# Altium footprint library MainFPs.PcbLib: 215 footprints (part 6 of 14)
Each footprint in its own frame and in the unit in brackets; x right, y up, seen from the top. Pads: shape width x height; smd on the part's side, far side on the other; paste and mask are expansions set on the pad; w line width, h text height; cw(c..) or ccw(c..) is an arc to the next point about the centre after c.
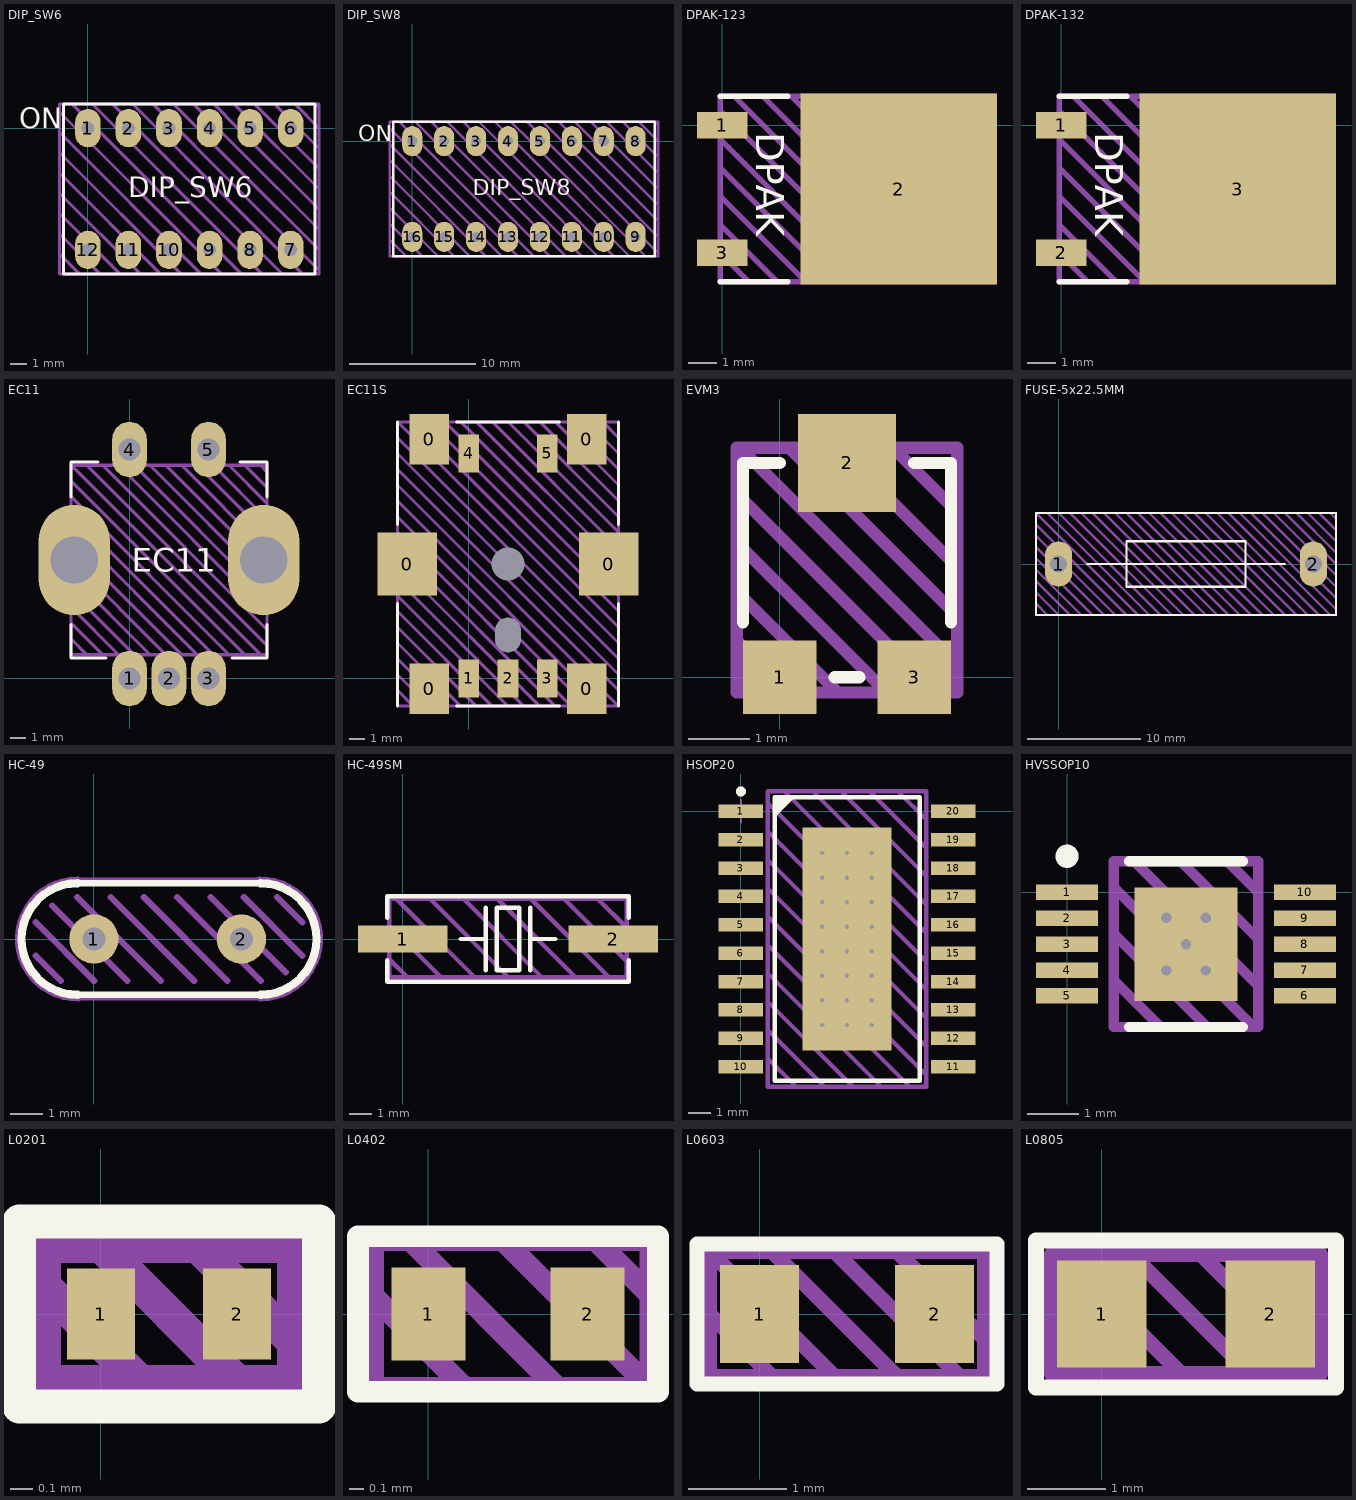
[diagram p5: the footprints below, top view; thin cyan lines are the x and y axes]

## DIP_SW6 [mm]
pads (12):
  oval 1.6x2.4 hole 0.8: 1(0,0) 2(2.54,0) 3(5.08,0) 4(7.62,0) 5(10.16,0) 6(12.7,0) 7(12.7,-7.62) 8(10.16,-7.62) 9(7.62,-7.62) 10(5.08,-7.62) 11(2.54,-7.62) 12(0,-7.62)
Top Overlay:
  lines w0.2: -1.524,-9.144 14.224,-9.144 14.224,1.524 -1.524,1.524 -1.524,-9.144
  text "ON" at -4.318,0 h1.27
  text "DIP_SW6" at 2.54,-4.318 h1.27
Top Draw:
  lines w0.2: -1.778,-7.874 -0.508,-9.144 ; -1.778,-6.604 0.762,-9.144 ; -1.778,-5.334 2.032,-9.144 ; -1.778,-4.064 3.302,-9.144 ; -1.778,-2.794 4.572,-9.144 ; -1.778,-1.524 5.842,-9.144 ; -1.778,-0.254 7.112,-9.144 ; -1.778,1.016 8.382,-9.144 ; -1.016,1.524 9.398,-8.89 9.652,-9.144 ; 0.254,1.524 9.398,-7.62 10.922,-9.144 ; 1.524,1.524 9.398,-6.35 12.192,-9.144 ; 2.794,1.524 9.398,-5.08 13.462,-9.144 ; 4.064,1.524 9.398,-3.81 14.478,-8.89 14.478,-9.144 ; 5.334,1.524 9.398,-2.54 14.478,-7.62 ; 6.604,1.524 9.398,-1.27 14.478,-6.35 ; 7.874,1.524 9.398,0 14.478,-5.08 ; 9.144,1.524 9.398,1.27 14.478,-3.81 ; 10.414,1.524 14.478,-2.54 ; 11.684,1.524 14.478,-1.27 ; 12.954,1.524 14.478,0 ; 14.224,1.524 14.478,1.27 ; 10.922,-9.144 10.922,-9.144 ; 14.478,-9.144 -1.778,-9.144 -1.778,1.524 14.478,1.524 14.478,-9.144
Top Info:
  text "'.Comment'" at 1.039,-11.016 h1.25
3D body: height 0.25, standoff -1.78, extent 12.446,-7.747 12.954,-7.493
3D body: height 0.25, standoff -1.78, extent 12.446,-0.127 12.954,0.127
3D body: height 0.25, standoff -1.78, extent 9.906,-0.127 10.414,0.127
3D body: height 0.25, standoff -1.78, extent 9.906,-7.747 10.414,-7.493
3D body: height 6.86, standoff 6.32, extent 10.922,-5.588 11.938,-2.032
3D body: height 6.86, standoff 6.32, extent 13.462,-5.588 14.478,-2.032
3D body: height 6.43, standoff 6.32, extent 9.398,-5.588 10.922,-2.032
3D body: height 7.62, standoff 6.32, extent 9.398,-3.302 10.922,-2.032
3D body: height 6.43, standoff 6.32, extent 11.938,-5.588 13.462,-2.032
3D body: height 7.62, standoff 6.32, extent 11.938,-3.302 13.462,-2.032
3D body: height 7.62, standoff 6.32, extent 6.858,-3.302 8.382,-2.032
3D body: height 6.43, standoff 6.32, extent 6.858,-5.588 8.382,-2.032
3D body: height 7.62, standoff 6.32, extent 4.318,-3.302 5.842,-2.032
3D body: height 6.43, standoff 6.32, extent 4.318,-5.588 5.842,-2.032
3D body: height 7.62, standoff 6.32, extent 1.778,-3.302 3.302,-2.032
3D body: height 6.43, standoff 6.32, extent 1.778,-5.588 3.302,-2.032
3D body: height 6.43, standoff 6.32, extent -0.762,-5.588 0.762,-2.032
3D body: height 6.86, standoff 6.32, extent 8.382,-5.588 9.398,-2.032
3D body: height 6.86, standoff 6.32, extent 5.842,-5.588 6.858,-2.032
3D body: height 6.86, standoff 6.32, extent 3.302,-5.588 4.318,-2.032
3D body: height 6.86, standoff 0.25, extent -1.778,-9.144 14.478,-5.588
3D body: height 6.86, standoff 0.25, extent -1.778,-2.032 14.478,1.524
3D body: height 6.35, standoff 0, extent -1.778,-9.144 14.478,1.524
3D body: height 0.25, standoff -1.78, extent -0.254,-7.747 0.254,-7.493
3D body: height 0.25, standoff -1.78, extent 2.286,-7.747 2.794,-7.493
3D body: height 0.25, standoff -1.78, extent 4.826,-7.747 5.334,-7.493
3D body: height 0.25, standoff -1.78, extent -0.254,-0.127 0.254,0.127
3D body: height 0.25, standoff -1.78, extent 2.286,-0.127 2.794,0.127
3D body: height 0.25, standoff -1.78, extent 4.826,-0.127 5.334,0.127
3D body: height 0.25, standoff -1.78, extent 7.366,-0.127 7.874,0.127
3D body: height 0.25, standoff -1.78, extent 7.366,-7.747 7.874,-7.493
3D body: height 6.86, standoff 6.32, extent -1.524,-5.588 -0.762,-2.032
3D body: height 6.86, standoff 6.32, extent 0.762,-5.588 1.778,-2.032
3D body: height 7.62, standoff 6.32, extent -0.762,-3.302 0.762,-2.032

## DIP_SW8 [mm]
pads (16):
  oval 1.6x2.4 hole 0.8: 1(0,0) 2(2.54,0) 3(5.08,0) 4(7.62,0) 5(10.16,0) 6(12.7,0) 7(15.24,0) 8(17.78,0) 9(17.78,-7.62) 10(15.24,-7.62) 11(12.7,-7.62) 12(10.16,-7.62) 13(7.62,-7.62) 14(5.08,-7.62) 15(2.54,-7.62) 16(0,-7.62)
Top Overlay:
  lines w0.2: -1.524,-9.144 -1.524,1.524 19.304,1.524 19.304,-1.143 19.304,-6.477 19.304,-9.144 -1.524,-9.144
  text "ON" at -4.318,0 h1.27
  text "DIP_SW8" at 4.826,-4.318 h1.27
Top Draw:
  lines w0.2: -1.778,-7.874 -0.508,-9.144 ; -1.778,-6.604 0.762,-9.144 ; -1.778,-5.334 2.032,-9.144 ; -1.778,-4.064 3.302,-9.144 ; -1.778,-2.794 4.572,-9.144 ; -1.778,-1.524 5.842,-9.144 ; -1.778,-0.254 7.112,-9.144 ; -1.778,1.016 8.382,-9.144 ; -1.016,1.524 9.398,-8.89 9.652,-9.144 ; 0.254,1.524 9.398,-7.62 10.922,-9.144 ; 1.524,1.524 9.398,-6.35 12.192,-9.144 ; 2.794,1.524 9.398,-5.08 13.462,-9.144 ; 4.064,1.524 9.398,-3.81 14.605,-9.017 ; 5.334,1.524 9.398,-2.54 16.002,-9.144 ; 6.604,1.524 9.398,-1.27 17.272,-9.144 17.78,-9.144 ; 7.874,1.524 9.398,0 18.542,-9.144 ; 9.144,1.524 9.398,1.27 19.558,-8.89 ; 10.414,1.524 19.558,-7.62 ; 11.684,1.524 19.558,-6.35 ; 12.954,1.524 19.558,-5.08 ; 14.224,1.524 19.558,-3.81 19.558,-9.144 14.478,-9.144 -1.778,-9.144 -1.778,1.524 19.558,1.524 19.558,-4.064 ; 15.494,1.524 19.558,-2.54 ; 16.764,1.524 19.558,-1.27 ; 18.034,1.524 19.558,0 ; 19.304,1.524 19.558,1.27 ; 10.922,-9.144 10.922,-9.144
Top Info:
  text "'.Comment'" at 3.579,-11.016 h1.25
3D body: height 6.86, standoff 6.32, extent 18.542,-5.588 19.558,-2.032
3D body: height 6.86, standoff 6.32, extent 16.002,-5.588 17.018,-2.032
3D body: height 6.43, standoff 6.32, extent 17.018,-5.588 18.542,-2.032
3D body: height 7.62, standoff 6.32, extent 17.018,-3.302 18.542,-2.032
3D body: height 6.43, standoff 6.32, extent 14.478,-5.588 16.002,-2.032
3D body: height 7.62, standoff 6.32, extent 14.478,-3.302 16.002,-2.032
3D body: height 7.62, standoff 6.32, extent -0.762,-3.302 0.762,-2.032
3D body: height 6.86, standoff 6.32, extent 0.762,-5.588 1.778,-2.032
3D body: height 6.86, standoff 6.32, extent -1.524,-5.588 -0.762,-2.032
3D body: height 0.25, standoff -1.78, extent 7.366,-7.747 7.874,-7.493
3D body: height 0.25, standoff -1.78, extent 7.366,-0.127 7.874,0.127
3D body: height 0.25, standoff -1.78, extent 4.826,-0.127 5.334,0.127
3D body: height 0.25, standoff -1.78, extent 2.286,-0.127 2.794,0.127
3D body: height 0.25, standoff -1.78, extent -0.254,-0.127 0.254,0.127
3D body: height 0.25, standoff -1.78, extent 4.826,-7.747 5.334,-7.493
3D body: height 0.25, standoff -1.78, extent 2.286,-7.747 2.794,-7.493
3D body: height 0.25, standoff -1.78, extent -0.254,-7.747 0.254,-7.493
3D body: height 6.35, standoff 0, extent -1.778,-9.144 19.558,1.524
3D body: height 6.86, standoff 0.25, extent -1.778,-2.032 19.558,1.524
3D body: height 6.86, standoff 0.25, extent -1.778,-9.144 19.558,-5.588
3D body: height 6.86, standoff 6.32, extent 3.302,-5.588 4.318,-2.032
3D body: height 6.86, standoff 6.32, extent 5.842,-5.588 6.858,-2.032
3D body: height 6.86, standoff 6.32, extent 8.382,-5.588 9.398,-2.032
3D body: height 6.43, standoff 6.32, extent -0.762,-5.588 0.762,-2.032
3D body: height 6.43, standoff 6.32, extent 1.778,-5.588 3.302,-2.032
3D body: height 7.62, standoff 6.32, extent 1.778,-3.302 3.302,-2.032
3D body: height 6.43, standoff 6.32, extent 4.318,-5.588 5.842,-2.032
3D body: height 7.62, standoff 6.32, extent 4.318,-3.302 5.842,-2.032
3D body: height 6.43, standoff 6.32, extent 6.858,-5.588 8.382,-2.032
3D body: height 7.62, standoff 6.32, extent 6.858,-3.302 8.382,-2.032
3D body: height 7.62, standoff 6.32, extent 11.938,-3.302 13.462,-2.032
3D body: height 6.43, standoff 6.32, extent 11.938,-5.588 13.462,-2.032
3D body: height 7.62, standoff 6.32, extent 9.398,-3.302 10.922,-2.032
3D body: height 6.43, standoff 6.32, extent 9.398,-5.588 10.922,-2.032
3D body: height 6.86, standoff 6.32, extent 13.462,-5.588 14.478,-2.032
3D body: height 6.86, standoff 6.32, extent 10.922,-5.588 11.938,-2.032
3D body: height 0.25, standoff -1.78, extent 9.906,-7.747 10.414,-7.493
3D body: height 0.25, standoff -1.78, extent 9.906,-0.127 10.414,0.127
3D body: height 0.25, standoff -1.78, extent 12.446,-0.127 12.954,0.127
3D body: height 0.25, standoff -1.78, extent 12.446,-7.747 12.954,-7.493
3D body: height 0.25, standoff -1.78, extent 14.986,-0.127 15.494,0.127
3D body: height 0.25, standoff -1.78, extent 17.526,-0.127 18.034,0.127
3D body: height 0.25, standoff -1.78, extent 17.526,-7.747 18.034,-7.493
3D body: height 0.25, standoff -1.78, extent 14.986,-7.747 15.494,-7.493

## DPAK-123 [mm] "TO-252"
pads (3):
  rect 1.8x0.95 smd: 1(0,0) 3(0,-4.56)
  rect 7x6.8 smd: 2(6.3,-2.28)
Top Overlay:
  lines w0.2: -0.073,-5.582 2.34,-5.582 ; -0.073,1.022 2.34,1.022
  text "DPAK" at 1.205,-0.253 h1
Top Draw:
  lines w0.2: -0.073,-4.566 0.943,-5.582 ; -0.073,-3.55 1.959,-5.582 ; -0.073,-2.534 2.975,-5.582 ; -0.073,-1.518 3.991,-5.582 ; -0.073,-0.502 5.007,-5.582 ; -0.073,0.514 6.023,-5.582 ; 0.435,1.022 7.039,-5.582 ; 1.451,1.022 8.055,-5.582 ; 2.467,1.022 9.071,-5.582 ; 3.483,1.022 9.706,-5.201 ; 4.499,1.022 9.706,-4.185 ; 5.515,1.022 9.706,-3.169 ; 6.531,1.022 9.706,-2.153 ; 7.547,1.022 9.706,-1.137 ; 8.563,1.022 9.706,-0.121 ; -0.073,-5.582 -0.073,1.022 9.706,1.022 9.706,-5.582 -0.073,-5.582
Top Info:
  text "'.Comment'" at 0.304,-7.254 h1
3D body "DPAK228P975X230-3N.step": height 2.3, standoff 0, extent -0.2,-5.53 9.55,0.97

## DPAK-132 [mm] "TO-252"
pads (3):
  rect 1.8x0.95 smd: 1(0,0) 2(0,-4.56)
  rect 7x6.8 smd: 3(6.3,-2.28)
Top Overlay:
  lines w0.2: -0.073,-5.582 2.34,-5.582 ; -0.073,1.022 2.34,1.022
  text "DPAK" at 1.205,-0.253 h1
Top Draw:
  lines w0.2: -0.073,-4.566 0.943,-5.582 ; -0.073,-3.55 1.959,-5.582 ; -0.073,-2.534 2.975,-5.582 ; -0.073,-1.518 3.991,-5.582 ; -0.073,-0.502 5.007,-5.582 ; -0.073,0.514 6.023,-5.582 ; 0.435,1.022 7.039,-5.582 ; 1.451,1.022 8.055,-5.582 ; 2.467,1.022 9.071,-5.582 ; 3.483,1.022 9.706,-5.201 ; 4.499,1.022 9.706,-4.185 ; 5.515,1.022 9.706,-3.169 ; 6.531,1.022 9.706,-2.153 ; 7.547,1.022 9.706,-1.137 ; 8.563,1.022 9.706,-0.121 ; -0.073,-5.582 -0.073,1.022 9.706,1.022 9.706,-5.582 -0.073,-5.582
Top Info:
  text "'.Comment'" at 0.304,-7.254 h1
3D body "DPAK228P975X230-3N.step": height 2.3, standoff 0, extent -0.2,-5.53 9.55,0.97

## EC11 [mm]
pads (7):
  oval 2.2x3.5 hole 1.4: 1(0,0) 2(2.5,0) 3(5,0) 4(0,14.5) 5(5,14.5)
  oval 4.5x7 hole 3: ""(-3.5,7.5) ""(8.5,7.5)
Top Overlay:
  lines w0.2: -3.7,3.4 -3.7,1.3 -1.5,1.3 ; -3.7,11.5 -3.7,13.7 -2,13.7 ; 6.5,1.3 8.7,1.3 8.7,3.4 ; 7,13.7 8.7,13.7 8.7,11.5
  text "EC11" at 0.126,6.75 h1.5
Top Draw:
  lines w0.2: -3.7,2.5 -2.7,1.5 ; -3.7,3.5 -1.7,1.5 ; -3.7,4.5 -0.7,1.5 ; -3.7,5.5 0.3,1.5 ; -3.7,6.5 1.3,1.5 ; -3.7,7.5 2.3,1.5 ; -3.7,8.5 3.3,1.5 ; -3.7,9.5 4.3,1.5 ; -3.7,10.5 5.3,1.5 ; -3.7,11.5 6.3,1.5 ; -3.7,12.5 7.3,1.5 ; -2.7,13.5 8.7,2.1 ; -1.7,13.5 8.7,3.1 ; -0.7,13.5 8.7,4.1 ; 0.3,13.5 8.7,5.1 ; 1.3,13.5 8.7,6.1 ; 2.3,13.5 8.7,7.1 ; 3.3,13.5 8.7,8.1 ; 4.3,13.5 8.7,9.1 ; 5.3,13.5 8.7,10.1 ; 6.3,13.5 8.7,11.1 ; 7.3,13.5 8.7,12.1 ; 8.3,1.5 -3.7,13.5 ; 8.3,13.5 8.7,13.1 ; -3.7,13.5 8.7,13.5 8.7,1.5 -3.7,1.5 -3.7,13.5
Top Info:
  text "'.Comment'" at -3.873,-3.975 h1.5
3D body "EC11-THT-15K-thread-green.step": height 19.5, standoff -3.5, extent -3.7,-0.2 8.7,14.7

## EC11S [mm]
pads (13):
  rect 3.75x4 smd: 0(-3.875,7.25) 0(8.875,7.25)
  rect 2.5x3.2 smd: 0(-2.5,-0.65) 0(-2.5,15.15) 0(7.5,-0.65) 0(7.5,15.15)
  rect 1.3x2.4 smd: 1(0,0) 2(2.5,0) 3(5,0) 4(0,14.25) 5(5,14.25)
  round 0 hole 1.6 slot 2.2 at 90 deg: ""(2.5,2.75)
  round 0 hole 2.1: ""(2.5,7.25)
Top Overlay:
  lines w0.2: -4.5,-1.75 -4.5,4.75 ; -4.5,9.75 -4.5,16.25 ; -0.75,-1.75 5.75,-1.75 ; -0.75,16.25 5.75,16.25 ; 9.5,-1.75 9.5,4.75 ; 9.5,9.75 9.5,16.25
Top Draw:
  lines w0.2: -4.5,-0.75 -3.5,-1.75 ; -4.5,0.25 -2.5,-1.75 ; -4.5,1.25 -1.5,-1.75 ; -4.5,2.25 -0.5,-1.75 ; -4.5,3.25 0.5,-1.75 ; -4.5,4.25 1.5,-1.75 ; -4.5,5.25 2.5,-1.75 ; -4.5,6.25 3.5,-1.75 ; -4.5,7.25 4.5,-1.75 ; -4.5,8.25 5.5,-1.75 ; -4.5,9.25 6.5,-1.75 ; -4.5,10.25 7.5,-1.75 ; -4.5,11.25 8.5,-1.75 ; -4.5,12.25 9.5,-1.75 ; -4.5,13.25 9.5,-0.75 ; -4.5,14.25 9.5,0.25 ; -4.5,15.25 9.5,1.25 ; -3.5,16.25 9.5,3.25 ; -2.5,16.25 9.5,4.25 ; -1.5,16.25 9.5,5.25 ; -0.5,16.25 9.5,6.25 ; 0.5,16.25 9.5,7.25 ; 1.5,16.25 9.5,8.25 ; 2.5,16.25 9.5,9.25 ; 3.5,16.25 9.5,10.25 ; 4.5,16.25 9.5,11.25 ; 5.5,16.25 9.5,12.25 ; 6.5,16.25 9.5,13.25 ; 7.5,16.25 9.5,14.25 ; 8.5,16.25 9.5,15.25 ; 9.5,2.25 -4.5,16.25 ; -4.5,16.25 -4.5,-1.75 9.5,-1.75 ; -4.5,16.25 9.5,16.25 9.5,-1.75
Top Info:
  text "'.Comment'" at -3.873,-4.425 h1.5
3D body "PEC11S-929K-S0015.step": height 14, standoff -1.2, extent -4.36,-1.68 9.36,16.18

## EVM3 [mm]
pads (3):
  rect 1.2x1.2 smd: 1(0,0) 3(2.2,0)
  rect 1.6x1.6 smd: 2(1.1,3.5)
Top Overlay:
  lines w0.2: -0.6,0.9 -0.6,3.5 0,3.5 ; 0.9,0 1.3,0 ; 2.2,3.5 2.8,3.5 2.8,0.9
Top Draw:
  lines w0.2: -0.7,0.6 0.125,-0.225 ; -0.7,1.4 0.95,-0.25 1.3,-0.25 ; -0.7,2.2 1.75,-0.25 2,-0.25 ; -0.7,3 2.55,-0.25 ; -0.6,3.7 2.9,0.2 ; 0.2,3.7 2.9,1 2.9,0.2 ; 1,3.7 2.9,1.8 2.9,1.2 ; 1.9,3.7 2.9,2.7 2.9,2.1 ; 2.9,-0.25 -0.7,-0.25 -0.7,3.75 2.9,3.75 2.9,-0.25 ; 2.9,-0.25 2.9,0.2
Top Info:
  text "'.Comment'" at -0.981,-1.435 h0.5

## FUSE-5x22.5MM [mm]
pads (2):
  oval 2.4x4 hole 1.5: 1(0,0) 2(22.5,0)
Top Overlay:
  lines w0.2: 2.5,0 20,0 ; -2,-4.5 -2,4.5 24.5,4.5 24.5,-4.5 -2,-4.5 ; 6,-2 16.5,-2 16.5,2 6,2 6,-2
Top Draw:
  lines w0.2: -2,-3.5 -1,-4.5 ; -2,-2.5 0,-4.5 ; -2,-1.5 1,-4.5 ; -2,-0.5 2,-4.5 ; -2,0.5 3,-4.5 ; -2,1.5 4,-4.5 ; -2,2.5 5,-4.5 ; -2,3.5 6,-4.5 ; -1,4.5 8,-4.5 ; 0,4.5 9,-4.5 ; 1,4.5 10,-4.5 ; 2,4.5 11,-4.5 ; 3,4.5 12,-4.5 ; 4,4.5 13,-4.5 ; 5,4.5 14,-4.5 ; 6,4.5 15,-4.5 ; 7,-4.5 -2,4.5 ; 7,4.5 16,-4.5 ; 8,4.5 17,-4.5 ; 9,4.5 18,-4.5 ; 10,4.5 19,-4.5 ; 11,4.5 20,-4.5 ; 12,4.5 21,-4.5 ; 13,4.5 22,-4.5 ; 14,4.5 23,-4.5 ; 15,4.5 24,-4.5 ; 16,4.5 24.5,-4 ; 17,4.5 24.5,-3 ; 18,4.5 24.5,-2 ; 19,4.5 24.5,-1 ; 20,4.5 24.5,0 ; 21,4.5 24.5,1 ; 22,4.5 24.5,2 ; 23,4.5 24.5,3 ; 24,4.5 24.5,4 ; -2,4.5 -2,-4.5 24.5,-4.5 24.5,4.5 -2,4.5
Top Info:
  text "'.Comment'" at 2.753,-7.416 h2

## HC-49 [mm]
pads (2):
  round 1.5 hole 0.7: 1(0,0) 2(4.5,0)
Top Overlay:
  lines w0.2: -0.529,-1.699 5.084,-1.699 ; -0.479,1.699 5.109,1.699
  lines w0.25: -0.504,-1.7 cw(c-0.504,0) -0.504,1.7 ; 5.084,-1.7 ccw(c5.084,0) 5.084,1.7
Top Draw:
  lines w0.2: -1.774,-0.508 -1.012,-1.27 ; -1.774,0.508 0.004,-1.27 ; -1.266,1.016 1.02,-1.27 ; -0.504,-1.778 5.084,-1.778 ; -0.504,1.27 2.036,-1.27 ; -0.504,1.778 5.084,1.778 ; 0.512,1.27 3.052,-1.27 ; 1.528,1.27 4.068,-1.27 ; 2.544,1.27 5.084,-1.27 ; 3.56,1.27 5.846,-1.016 ; 4.576,1.27 6.354,-0.508 ; 5.592,1.27 6.354,0.508
  lines w0.25: -0.504,1.779 ccw(c-0.504,0) -0.479,-1.779 ; 5.059,1.779 cw(c5.084,0) 5.084,-1.779
Top Info:
  text "'.Comment'" at -0.886,-2.937 h0.75
3D body: height 0.25, standoff -1.78, extent 4.246,-0.254 4.754,0.254
3D body: height 0.25, standoff -1.78, extent -0.254,-0.254 0.254,0.254
3D body: height 2.26, standoff 0.23, extent 3.687,-1.27 6.227,1.27
3D body: height 0.25, standoff 0, extent 3.433,-1.651 6.735,1.651
3D body: height 0.25, standoff 0, extent -2.155,-1.651 1.147,1.651
3D body: height 2.26, standoff 0.23, extent -1.647,-1.27 0.893,1.27
3D body: height 2.26, standoff 0.23, extent -0.382,-1.268 4.952,1.267
3D body: height 0.25, standoff 0, extent -0.377,-1.651 4.957,1.651

## HC-49SM [mm]
pads (2):
  rect 4x1.2 smd: 1(0,0) 2(9.4,0)
Top Overlay:
  lines w0.2: -0.7,-0.95 -0.7,-1.9 10.1,-1.9 10.1,-0.95 ; -0.7,0.95 -0.7,1.9 10.1,1.9 10.1,0.95 ; 2.6,0 3.7,0 ; 3.7,-1.4 3.7,0 ; 3.7,1.4 3.7,0 ; 5.7,-1.4 5.7,0 ; 5.7,1.4 5.7,0 ; 6.8,0 5.7,0 ; 4.2,-1.4 5.2,-1.4 5.2,1.4 4.2,1.4 4.2,-1.4
Top Draw:
  lines w0.2: -0.6,-0.9 0.2,-1.7 ; -0.241,1.759 3.2,-1.7 ; 1.259,1.759 4.7,-1.7 ; 1.7,-1.7 -0.6,0.6 ; 2.759,1.759 6.2,-1.7 ; 4.259,1.759 7.7,-1.7 ; 5.759,1.759 9.2,-1.7 ; 7.2,1.8 10,-1 10,-1.3 ; 8.7,1.8 10,0.5 10,0 ; -0.6,0.6 -0.6,0.6 ; -0.6,-1.7 -0.6,1.8 10,1.8 10,-1.7 -0.6,-1.7
Top Info:
  text "'.Comment'" at 0.451,-3.483 h1
3D body: height 0.1, standoff 0, extent 7.1,-0.5 11.1,0.5
3D body: height 0.1, standoff 0, extent -1.7,-0.5 2.3,0.5
3D body: height 3.5, standoff 0.1, extent -0.2,-1.7 9.6,1.7
3D body: height 0.6, standoff 0.1, extent -0.45,-1.9 9.85,1.9
3D body: height 0.3, standoff 0.05, extent -0.6,-2 10,2

## HSOP20 [mm]
height 2.5
pads (21):
  rect 2x0.6 smd: 1(0,0) 2(0,-1.27) 3(0,-2.54) 4(0,-3.81) 5(0,-5.08) 6(0,-6.35) 7(0,-7.62) 8(0,-8.89) 9(0,-10.16) 10(0,-11.43) 11(9.5,-11.43) 12(9.5,-10.16) 13(9.5,-8.89) 14(9.5,-7.62) 15(9.5,-6.35) 16(9.5,-5.08) 17(9.5,-3.81) 18(9.5,-2.54) 19(9.5,-1.27) 20(9.5,0)
  rect 4x10 smd: ""(4.75,-5.715)
via 5.85,-7.365 diameter 0.5 hole 0.2
via 4.75,-7.365 diameter 0.5 hole 0.2
via 3.65,-7.365 diameter 0.5 hole 0.2
via 5.85,-6.265 diameter 0.5 hole 0.2
via 4.75,-6.265 diameter 0.5 hole 0.2
via 3.65,-6.265 diameter 0.5 hole 0.2
via 5.85,-5.165 diameter 0.5 hole 0.2
via 4.75,-5.165 diameter 0.5 hole 0.2
via 3.65,-5.165 diameter 0.5 hole 0.2
via 5.85,-4.065 diameter 0.5 hole 0.2
via 4.75,-4.065 diameter 0.5 hole 0.2
via 3.65,-4.065 diameter 0.5 hole 0.2
via 5.85,-2.965 diameter 0.5 hole 0.2
via 4.75,-2.965 diameter 0.5 hole 0.2
via 3.65,-2.965 diameter 0.5 hole 0.2
via 5.85,-1.865 diameter 0.5 hole 0.2
via 4.75,-1.865 diameter 0.5 hole 0.2
via 3.65,-1.865 diameter 0.5 hole 0.2
via 5.85,-8.465 diameter 0.5 hole 0.2
via 4.75,-8.465 diameter 0.5 hole 0.2
via 3.65,-8.465 diameter 0.5 hole 0.2
via 5.85,-9.565 diameter 0.5 hole 0.2
via 4.75,-9.565 diameter 0.5 hole 0.2
via 3.65,-9.565 diameter 0.5 hole 0.2
Top Overlay:
  circle w0.25: c0,0.889 r0.1
  region: 1.524,-0.254 2.413,0.635 1.524,0.635
  lines w0.2: 1.524,-12.065 8.001,-12.065 8.001,0.635 1.524,0.635 1.524,-12.065
Top Draw:
  lines w0.2: 1.194,-11.049 2.464,-12.319 ; 1.194,-9.779 3.734,-12.319 ; 1.194,-8.509 5.004,-12.319 ; 1.194,-7.239 6.274,-12.319 ; 1.194,-5.969 7.544,-12.319 ; 1.194,-4.699 8.306,-11.811 ; 1.194,-3.429 8.306,-10.541 ; 1.194,-2.159 8.306,-9.271 ; 1.194,-0.889 8.306,-8.001 ; 1.194,0.381 8.306,-6.731 ; 1.194,0.87 1.194,-12.319 8.306,-12.319 8.306,0.889 1.213,0.889 ; 1.956,0.889 8.306,-5.461 ; 3.226,0.889 8.306,-4.191 ; 4.496,0.889 8.306,-2.921 ; 5.766,0.889 8.306,-1.651 ; 7.036,0.889 8.306,-0.381
Top Info:
  text "'.Comment'" at 0.559,-13.716 h1
Mechanical 15:
  lines w0.1: -0.5,0 0.5,0 ; 0,-0.5 0,0.5
3D body "SOP127P600-8N.step": height 2.5, standoff 0, extent -0.45,-12.215 9.95,0.785

## HVSSOP10 [mm]
height 1.1
pads (11):
  rect 1.2x0.3 smd: 1(0,0) 2(0,-0.5) 3(0,-1) 4(0,-1.5) 5(0,-2) 6(4.6,-2) 7(4.6,-1.5) 8(4.6,-1) 9(4.6,-0.5) 10(4.6,0)
  rect 2x2.2 smd: ""(2.3,-1)
via 2.3,-1 diameter 0.4 hole 0.2
via 1.919,-1.508 diameter 0.4 hole 0.2
via 2.681,-1.508 diameter 0.4 hole 0.2
via 2.681,-0.492 diameter 0.4 hole 0.2
via 1.919,-0.492 diameter 0.4 hole 0.2
Top Overlay:
  circle w0.25: c0,0.7 r0.1
  lines w0.2: 1.2,-2.6 3.4,-2.6 ; 1.2,0.6 3.4,0.6
Top Draw:
  lines w0.2: 0.9,-1.7 1.8,-2.6 ; 0.9,-0.8 2.7,-2.6 ; 0.9,0.1 3.6,-2.6 ; 1.3,0.6 3.7,-1.8 ; 2.2,0.6 3.7,-0.9 ; 3.1,0.6 3.7,0 ; 0.9,-2.6 3.7,-2.6 3.7,0.6 0.9,0.6 0.9,-2.6
Top Info:
  text "'.Comment'" at -0.886,-3.737 h0.75
3D body "HVSSOP10.step": height 1.1, standoff 0, extent -0.162,-2.55 4.763,0.55

## L0201 [mm]
height 0.3
pads (2):
  rect 0.3x0.4 smd: 1(0,0) 2(0.6,0)
Top Overlay:
  lines w0.15: -0.36,-0.406 -0.36,0.406 0.96,0.406 0.96,0.381 0.96,-0.406 -0.36,-0.406
Top Draw:
  lines w0.15: -0.25,0.125 0.175,-0.3 ; 0,0.3 0.6,-0.3 ; 0.425,0.3 0.85,-0.125 ; -0.25,-0.3 0.85,-0.3 0.85,0.3 -0.25,0.3 -0.25,-0.3
Top Info:
  text "'.Comment'" at -0.762,-0.846 h0.25
3D body "L0201.step": height 0.3, standoff 0, extent 0,-0.15 0.6,0.15

## L0402 [mil]
pads (2):
  rect 20x25 smd: 1(0,0) 2(43,0)
Top Overlay:
  lines w5.91: -19,-21 62,-21 62,21 -19,21 -19,-21
Top Draw:
  lines w5.91: -15,5 10,-20 ; -5,20 35,-20 ; 20,20 60,-20 ; 45,20 60,5 ; 60,-20 -15,-20 -15,20 60,20 60,-20
Top Info:
  text "'.Comment'" at -38.86,-43.47 h13.78
3D body "Chip2PinSM127P600-8N.step": height 13.78, standoff 0, extent 2,-10 41.37,9.68

## L0603 [mm]
pads (2):
  rect 0.8x1 smd: 1(0,0) 2(1.778,0)
Top Overlay:
  lines w0.15: -0.635,-0.711 2.413,-0.711 2.413,0.711 -0.635,0.711 -0.635,-0.711
Top Draw:
  lines w0.15: -0.508,0 0.127,-0.635 ; 0.127,0.635 1.397,-0.635 ; 0.762,-0.635 -0.508,0.635 ; 0.762,0.635 2.032,-0.635 ; 1.397,0.635 2.286,-0.254 ; -0.508,0.635 2.286,0.635 2.286,-0.635 -0.508,-0.635 -0.508,0.635
Top Info:
  text "'.Comment'" at -1.224,-1.492 h0.5
3D body "Chip2PinSM127P600-8N11.step": height 0.45, standoff 0, extent 0.114,-0.425 1.664,0.425

## L0805 [mil]
pads (2):
  rect 45x54 smd: 1(0,0) 2(85,0)
Top Overlay:
  lines w7.87: -33,-37 -33,37 118,37 118,-37 -33,-37
Top Draw:
  lines w7.87: -25,0 5,-30 ; -20,30 40,-30 ; 15,30 75,-30 ; 35,-30 42.5,-30 ; 50,30 110,-30 ; 85,30 110,5 ; 110,-30 110,30 -25,30 -25,-30 110,-30
Top Info:
  text "'.Comment'" at -82.14,-84.15 h29.53
3D body "Chip2PinSM127P600-8N.step": height 23.62, standoff 0, extent 3.63,-23.62 82.37,23.62